# Altium footprint library domino-rising-cage-clamp.PcbLib: 435 footprints (part 24 of 28)
Each footprint in its own frame and in the unit in brackets; x right, y up, seen from the top. Pads: shape width x height; smd on the part's side, far side on the other; paste and mask are expansions set on the pad; w line width, h text height; cw(c..) or ccw(c..) is an arc to the next point about the centre after c.
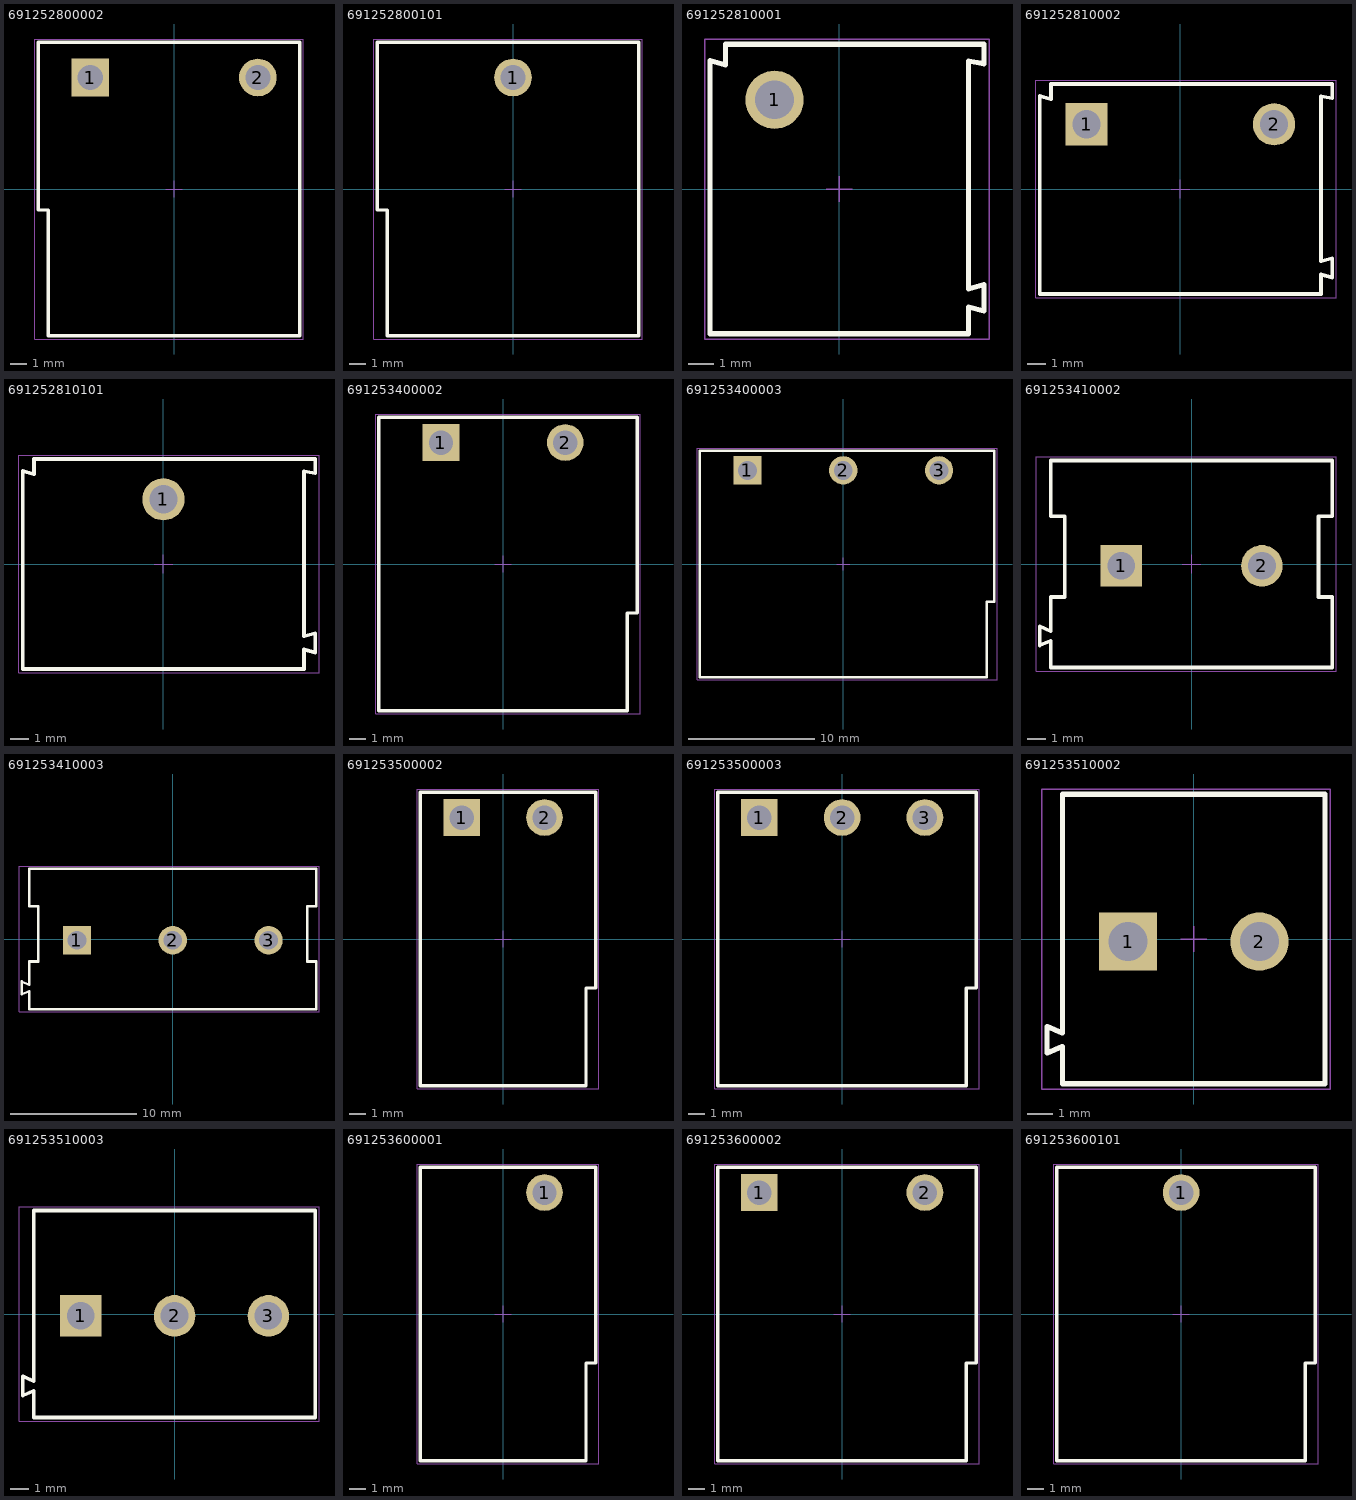
[diagram p23: the footprints below, top view; thin cyan lines are the x and y axes]

## 691252800002 [mm] "Serie 2528-10mm Vertical Cable Entry, 02p"
height 16
pads (2):
  rect 2.25x2.25 hole 1.5: 1(-5,6.65)
  round 2.25 hole 1.5: 2(5,6.65)
Top Overlay:
  lines w0.2: -8.1,-1.25 -8.1,8.75 7.5,8.75 7.5,-8.75 -7.5,-8.75 -7.5,-1.25 -8.1,-1.25
Mechanical 13:
  lines w0.1: -8.1,-1.25 -7.5,-1.25 -7.5,-8.75 7.5,-8.75 7.5,8.75 -8.1,8.75 -8.1,-1.25
Mechanical 15:
  lines w0.05: -0.5,0 0.5,0 ; 0,-0.5 0,0.5 ; -8.3,-8.95 7.7,-8.95 7.7,8.95 -8.3,8.95 -8.3,-8.95
3D body "691252800002.stp": height 16.1, standoff -2.9, extent -8.1,-8.75 7.5,8.75

## 691252800101 [mm] "Serie 2528-10mm Vertical Cable Entry, 01p"
height 16
pads (1):
  round 2.25 hole 1.5: 1(0,6.65)
Top Overlay:
  lines w0.2: -8.1,-1.25 -8.1,8.75 7.5,8.75 7.5,-8.75 -7.5,-8.75 -7.5,-1.25 -8.1,-1.25
Mechanical 13:
  lines w0.1: -8.1,-1.25 -7.5,-1.25 -7.5,-8.75 7.5,-8.75 7.5,8.75 -8.1,8.75 -8.1,-1.25
Mechanical 15:
  lines w0.05: -0.5,0 0.5,0 ; 0,-0.5 0,0.5 ; -8.3,-8.95 7.7,-8.95 7.7,8.95 -8.3,8.95 -8.3,-8.95
3D body "691252800101.stp": height 16.1, standoff -2.9, extent -8.1,-8.75 7.5,8.75

## 691252810001 [mm] "Serie 2528 - 10.00 mm _ 1 pin"
height 17.5
pads (1):
  round 2.25 hole 1.5: 1(-2.5,3.45)
Top Overlay:
  lines w0.2: -4.4,4.79 -4.4,5.6 5.6,5.6 5.6,4.84 ; -4.399,4.792 -5,4.96 -5,-5.6 5,-5.6 5,-4.56 5.6,-4.72 ; 5.6,-4.72 5.6,-3.7 ; 5.6,-3.7 5,-3.86 5,4.95 5.601,4.843
Mechanical 13:
  lines w0.1: -4.4,4.79 -4.4,5.6 5.6,5.6 5.6,4.84 ; -4.399,4.792 -5,4.96 -5,-5.6 5,-5.6 5,-4.56 5.6,-4.72 ; 5.6,-4.72 5.6,-3.7 ; 5.6,-3.7 5,-3.86 5,4.95 5.601,4.843
Mechanical 15:
  lines w0.05: -0.5,0 0.5,0 ; 0,-0.5 0,0.5 ; -5.2,-5.8 5.8,-5.8 5.8,5.8 -5.2,5.8 -5.2,-5.8
3D body "691252810001.stp": height 17.7, standoff -2.8, extent -5,-5.6 5.6,5.6

## 691252810002 [mm] "Serie 2528 - 10.00 mm _ 2 pins"
height 17.5
pads (2):
  rect 2.25x2.25 hole 1.5: 1(-5,3.45)
  round 2.25 hole 1.5: 2(5,3.45)
Top Overlay:
  lines w0.2: -6.9,4.79 -6.9,5.6 8.1,5.6 8.1,4.84 ; -6.899,4.792 -7.5,4.96 -7.5,-5.6 7.5,-5.6 7.5,-4.56 8.1,-4.72 ; 8.1,-4.72 8.1,-3.7 ; 8.1,-3.7 7.5,-3.86 7.5,4.95 8.101,4.843
Mechanical 13:
  lines w0.1: -6.9,4.79 -6.9,5.6 8.1,5.6 8.1,4.84 ; -6.899,4.792 -7.5,4.96 -7.5,-5.6 7.5,-5.6 7.5,-4.56 8.1,-4.72 ; 8.1,-4.72 8.1,-3.7 ; 8.1,-3.7 7.5,-3.86 7.5,4.95 8.101,4.843
Mechanical 15:
  lines w0.05: -0.5,0 0.5,0 ; 0,-0.5 0,0.5 ; -7.7,-5.8 -7.7,5.8 8.3,5.8 8.3,-5.8 -7.7,-5.8
3D body "691252810002.stp": height 17.7, standoff -2.8, extent -7.5,-5.6 8.1,5.6

## 691252810101 [mm] "Serie 2528 - 10.00 mm _ 1 pin"
height 17.5
pads (1):
  round 2.25 hole 1.5: 1(0,3.45)
Top Overlay:
  lines w0.2: -6.9,4.79 -6.9,5.6 8.1,5.6 8.1,4.84 ; -6.899,4.792 -7.5,4.96 -7.5,-5.6 7.5,-5.6 7.5,-4.56 8.1,-4.72 ; 8.1,-4.72 8.1,-3.7 ; 8.1,-3.7 7.5,-3.86 7.5,4.95 8.101,4.843
Mechanical 13:
  lines w0.1: -6.9,4.79 -6.9,5.6 8.1,5.6 8.1,4.84 ; -6.899,4.792 -7.5,4.96 -7.5,-5.6 7.5,-5.6 7.5,-4.56 8.1,-4.72 ; 8.1,-4.72 8.1,-3.7 ; 8.1,-3.7 7.5,-3.86 7.5,4.95 8.101,4.843
Mechanical 15:
  lines w0.05: -0.5,0 0.5,0 ; 0,-0.5 0,0.5 ; -7.7,-5.8 8.3,-5.8 8.3,5.8 -7.7,5.8 -7.7,-5.8
3D body "691252810101.stp": height 17.7, standoff -2.8, extent -7.5,-5.6 8.1,5.6

## 691253400002 [mm] "Serie 2534 - 7.62 mm _ 2 pins"
height 11.2
pads (2):
  rect 2.25x2.25 hole 1.5: 1(-3.81,7.45)
  round 2.25 hole 1.5: 2(3.81,7.45)
Top Overlay:
  lines w0.2: -7.62,-9 -7.62,9 8.22,9 8.22,-3 7.62,-3 7.62,-9 -7.62,-9
Mechanical 13:
  lines w0.1: -7.62,-9 7.62,-9 7.62,-3 8.22,-3 8.22,9 -7.62,9 -7.62,-9
Mechanical 15:
  lines w0.05: -0.5,0 0.5,0 ; 0,-0.5 0,0.5 ; -7.82,-9.2 -7.82,9.2 8.42,9.2 8.42,-9.2 -7.82,-9.2
3D body "691253400002.stp": height 11.3, standoff -3.9, extent -7.62,-9 8.22,9

## 691253400003 [mm] "Serie 2534 - 7.62 mm _ 3 pins"
height 11.2
pads (3):
  rect 2.25x2.25 hole 1.5: 1(-7.62,7.45)
  round 2.25 hole 1.5: 2(0,7.45) 3(7.62,7.45)
Top Overlay:
  lines w0.2: -11.43,-9 11.43,-9 11.43,-3 12.03,-3 12.03,9 -11.43,9 -11.43,-9
Mechanical 13:
  lines w0.1: -11.43,-9 -11.43,9 12.03,9 12.03,-3 11.43,-3 11.43,-9 -11.43,-9
Mechanical 15:
  lines w0.05: -0.5,0 0.5,0 ; 0,-0.5 0,0.5 ; -11.63,-9.2 12.23,-9.2 12.23,9.2 -11.63,9.2 -11.63,-9.2
3D body "691253400003.stp": height 11.3, standoff -3.9, extent -11.43,-9 12.03,9

## 691253410002 [mm] "Serie 2534 - 7.62 mm _ 2 pins"
height 18
pads (2):
  rect 2.25x2.25 hole 1.5: 1(-3.81,-0.1)
  round 2.25 hole 1.5: 2(3.81,-0.1)
Top Overlay:
  lines w0.2: -7.62,-5.6 -7.62,-4.15 -8.22,-4.41 -8.22,-3.38 -7.62,-3.64 -7.62,-1.79 -6.87,-1.79 -6.87,2.59 -7.62,2.59 -7.62,5.6 7.62,5.6 7.62,2.59 6.87,2.59 6.87,-1.79 7.62,-1.79 7.62,-5.6 -7.62,-5.6
Mechanical 13:
  lines w0.1: -7.62,-5.6 -7.62,-4.15 -8.22,-4.41 -8.22,-3.38 -7.62,-3.64 -7.62,-1.79 -6.87,-1.79 -6.87,2.59 -7.62,2.59 -7.62,5.6 7.62,5.6 7.62,2.59 6.87,2.59 6.87,-1.79 7.62,-1.79 7.62,-5.6 -7.62,-5.6
Mechanical 15:
  lines w0.05: -0.5,0 0.5,0 ; 0,-0.5 0,0.5 ; -8.42,-5.8 -8.42,5.8 7.82,5.8 7.82,-5.8 -8.42,-5.8
3D body "691253410002.stp": height 18.1, standoff -3.9, extent -8.22,-5.6 7.62,5.6

## 691253410003 [mm] "Serie 2534 - 7.62 mm _ 3 pins"
height 18
pads (3):
  rect 2.25x2.25 hole 1.5: 1(-7.62,-0.1)
  round 2.25 hole 1.5: 2(0,-0.1) 3(7.62,-0.1)
Top Overlay:
  lines w0.2: -11.43,-5.6 -11.43,-4.15 -12.03,-4.41 -12.03,-3.38 -11.43,-3.64 -11.43,-1.79 -10.68,-1.79 -10.68,2.59 -11.43,2.59 -11.43,5.6 11.43,5.6 11.43,2.59 10.68,2.59 10.68,-1.79 11.43,-1.79 11.43,-5.6 -11.43,-5.6
Mechanical 13:
  lines w0.1: -11.43,-5.6 -11.43,-4.15 -12.03,-4.41 -12.03,-3.38 -11.43,-3.64 -11.43,-1.79 -10.68,-1.79 -10.68,2.59 -11.43,2.59 -11.43,5.6 11.43,5.6 11.43,2.59 10.68,2.59 10.68,-1.79 11.43,-1.79 11.43,-5.6 -11.43,-5.6
Mechanical 15:
  lines w0.05: -0.5,0 0.5,0 ; 0,-0.5 0,0.5 ; -12.23,-5.8 11.63,-5.8 11.63,5.8 -12.23,5.8 -12.23,-5.8
3D body "691253410003.stp": height 18.1, standoff -3.9, extent -12.03,-5.6 11.43,5.6

## 691253500002 [mm] "Serie 2535 - 5.08 mm _ 2 pins"
height 11.2
pads (2):
  rect 2.25x2.25 hole 1.5: 1(-2.54,7.45)
  round 2.25 hole 1.5: 2(2.54,7.45)
Top Overlay:
  lines w0.2: -5.08,-9 -5.08,9 5.68,9 5.68,-3 5.08,-3 5.08,-9 -5.08,-9
Mechanical 13:
  lines w0.1: -5.08,-9 5.08,-9 5.08,-3 5.68,-3 5.68,9 -5.08,9 -5.08,-9
Mechanical 15:
  lines w0.05: -0.5,0 0.5,0 ; 0,-0.5 0,0.5 ; -5.28,-9.2 5.88,-9.2 5.88,9.2 -5.28,9.2 -5.28,-9.2
3D body "691253500002.stp": height 11.35, standoff -3.85, extent -5.06,-9.05 5.7,8.95

## 691253500003 [mm] "Serie 2535 - 5.08 mm _ 3 pins"
height 11.2
pads (3):
  rect 2.25x2.25 hole 1.5: 1(-5.08,7.45)
  round 2.25 hole 1.5: 2(0,7.45) 3(5.08,7.45)
Top Overlay:
  lines w0.2: -7.62,-9 7.62,-9 7.62,-3 8.22,-3 8.22,9 -7.62,9 -7.62,-9
Mechanical 13:
  lines w0.1: -7.62,-9 -7.62,9 8.22,9 8.22,-3 7.62,-3 7.62,-9 -7.62,-9
Mechanical 15:
  lines w0.05: -0.5,0 0.5,0 ; 0,-0.5 0,0.5 ; -7.82,-9.2 -7.82,9.2 8.42,9.2 8.42,-9.2 -7.82,-9.2
3D body "691253500003.stp": height 11.35, standoff -3.85, extent -7.6,-9.05 8.24,8.95

## 691253510002 [mm] "Serie 2535 - 5.08 mm _ 2 pins"
height 18
pads (2):
  rect 2.25x2.25 hole 1.5: 1(-2.54,-0.1)
  round 2.25 hole 1.5: 2(2.54,-0.1)
Top Overlay:
  lines w0.2: -5.67,-4.41 -5.67,-3.38 -5.08,-3.636 -5.08,5.6 5.08,5.6 5.08,-5.6 -5.08,-5.6 -5.08,-4.154 -5.67,-4.41
Mechanical 13:
  lines w0.1: -5.67,-4.41 -5.08,-4.154 -5.08,-5.6 5.08,-5.6 5.08,5.6 -5.08,5.6 -5.08,-3.636 -5.67,-3.38 -5.67,-4.41
Mechanical 15:
  lines w0.05: -0.5,0 0.5,0 ; 0,-0.5 0,0.5 ; -5.88,-5.8 5.28,-5.8 5.28,5.8 -5.88,5.8 -5.88,-5.8
3D body "691253510002.stp": height 18.1, standoff -3.9, extent -5.67,-5.6 5.09,5.6

## 691253510003 [mm] "Serie 2535 - 5.08 mm _ 3 pins"
height 18
pads (3):
  rect 2.25x2.25 hole 1.5: 1(-5.08,-0.1)
  round 2.25 hole 1.5: 2(0,-0.1) 3(5.08,-0.1)
Top Overlay:
  lines w0.2: -8.21,-4.41 -7.62,-4.154 -7.62,-5.6 7.62,-5.6 7.62,5.6 -7.62,5.6 -7.62,-3.636 -8.21,-3.38 -8.21,-4.41
Mechanical 13:
  lines w0.1: -8.21,-4.41 -8.21,-3.38 -7.62,-3.636 -7.62,5.6 7.62,5.6 7.62,-5.6 -7.62,-5.6 -7.62,-4.154 -8.21,-4.41
Mechanical 15:
  lines w0.05: -0.5,0 0.5,0 ; 0,-0.5 0,0.5 ; -8.42,-5.8 -8.42,5.8 7.82,5.8 7.82,-5.8 -8.42,-5.8
3D body "691253510003.stp": height 18.1, standoff -3.9, extent -8.21,-5.6 7.63,5.6

## 691253600001 [mm] "Serie 2536 - 10.16 mm _ 1 pin"
height 11.2
pads (1):
  round 2.25 hole 1.5: 1(2.54,7.45)
Top Overlay:
  lines w0.2: -5.08,-9 5.08,-9 5.08,-3 5.68,-3 5.68,9 -5.08,9 -5.08,-9
Mechanical 13:
  lines w0.1: -5.08,-9 -5.08,9 5.68,9 5.68,-3 5.08,-3 5.08,-9 -5.08,-9
Mechanical 15:
  lines w0.05: -0.5,0 0.5,0 ; 0,-0.5 0,0.5 ; -5.28,-9.2 -5.28,9.2 5.88,9.2 5.88,-9.2 -5.28,-9.2
3D body "691253600001.stp": height 11.35, standoff -3.85, extent -5.06,-8.95 5.7,9.05

## 691253600002 [mm] "Serie 2536 - 10.16 mm _ 2 pins"
height 11.2
pads (2):
  rect 2.25x2.25 hole 1.5: 1(-5.08,7.45)
  round 2.25 hole 1.5: 2(5.08,7.45)
Top Overlay:
  lines w0.2: -7.62,-9 -7.62,9 8.22,9 8.22,-3 7.62,-3 7.62,-9 -7.62,-9
Mechanical 13:
  lines w0.1: -7.62,-9 7.62,-9 7.62,-3 8.22,-3 8.22,9 -7.62,9 -7.62,-9
Mechanical 15:
  lines w0.05: -0.5,0 0.5,0 ; 0,-0.5 0,0.5 ; -7.82,-9.2 8.42,-9.2 8.42,9.2 -7.82,9.2 -7.82,-9.2
3D body "691253600002.stp": height 11.35, standoff -3.85, extent -7.6,-8.95 8.24,9.05

## 691253600101 [mm] "Serie 2536 - 10.16 mm _ 1 pin"
height 11.2
pads (1):
  round 2.25 hole 1.5: 1(0,7.45)
Top Overlay:
  lines w0.2: -7.62,-9 -7.62,9 8.22,9 8.22,-3 7.62,-3 7.62,-9 -7.62,-9
Mechanical 13:
  lines w0.1: -7.62,-9 7.62,-9 7.62,-3 8.22,-3 8.22,9 -7.62,9 -7.62,-9
Mechanical 15:
  lines w0.05: -0.5,0 0.5,0 ; 0,-0.5 0,0.5 ; -7.82,-9.2 8.42,-9.2 8.42,9.2 -7.82,9.2 -7.82,-9.2
3D body "691253600101.stp": height 11.35, standoff -3.85, extent -7.62,-9 8.22,9